# Altium schematic symbol library IC_TI.SCHLIB: 1162 symbols (part 2 of 8)
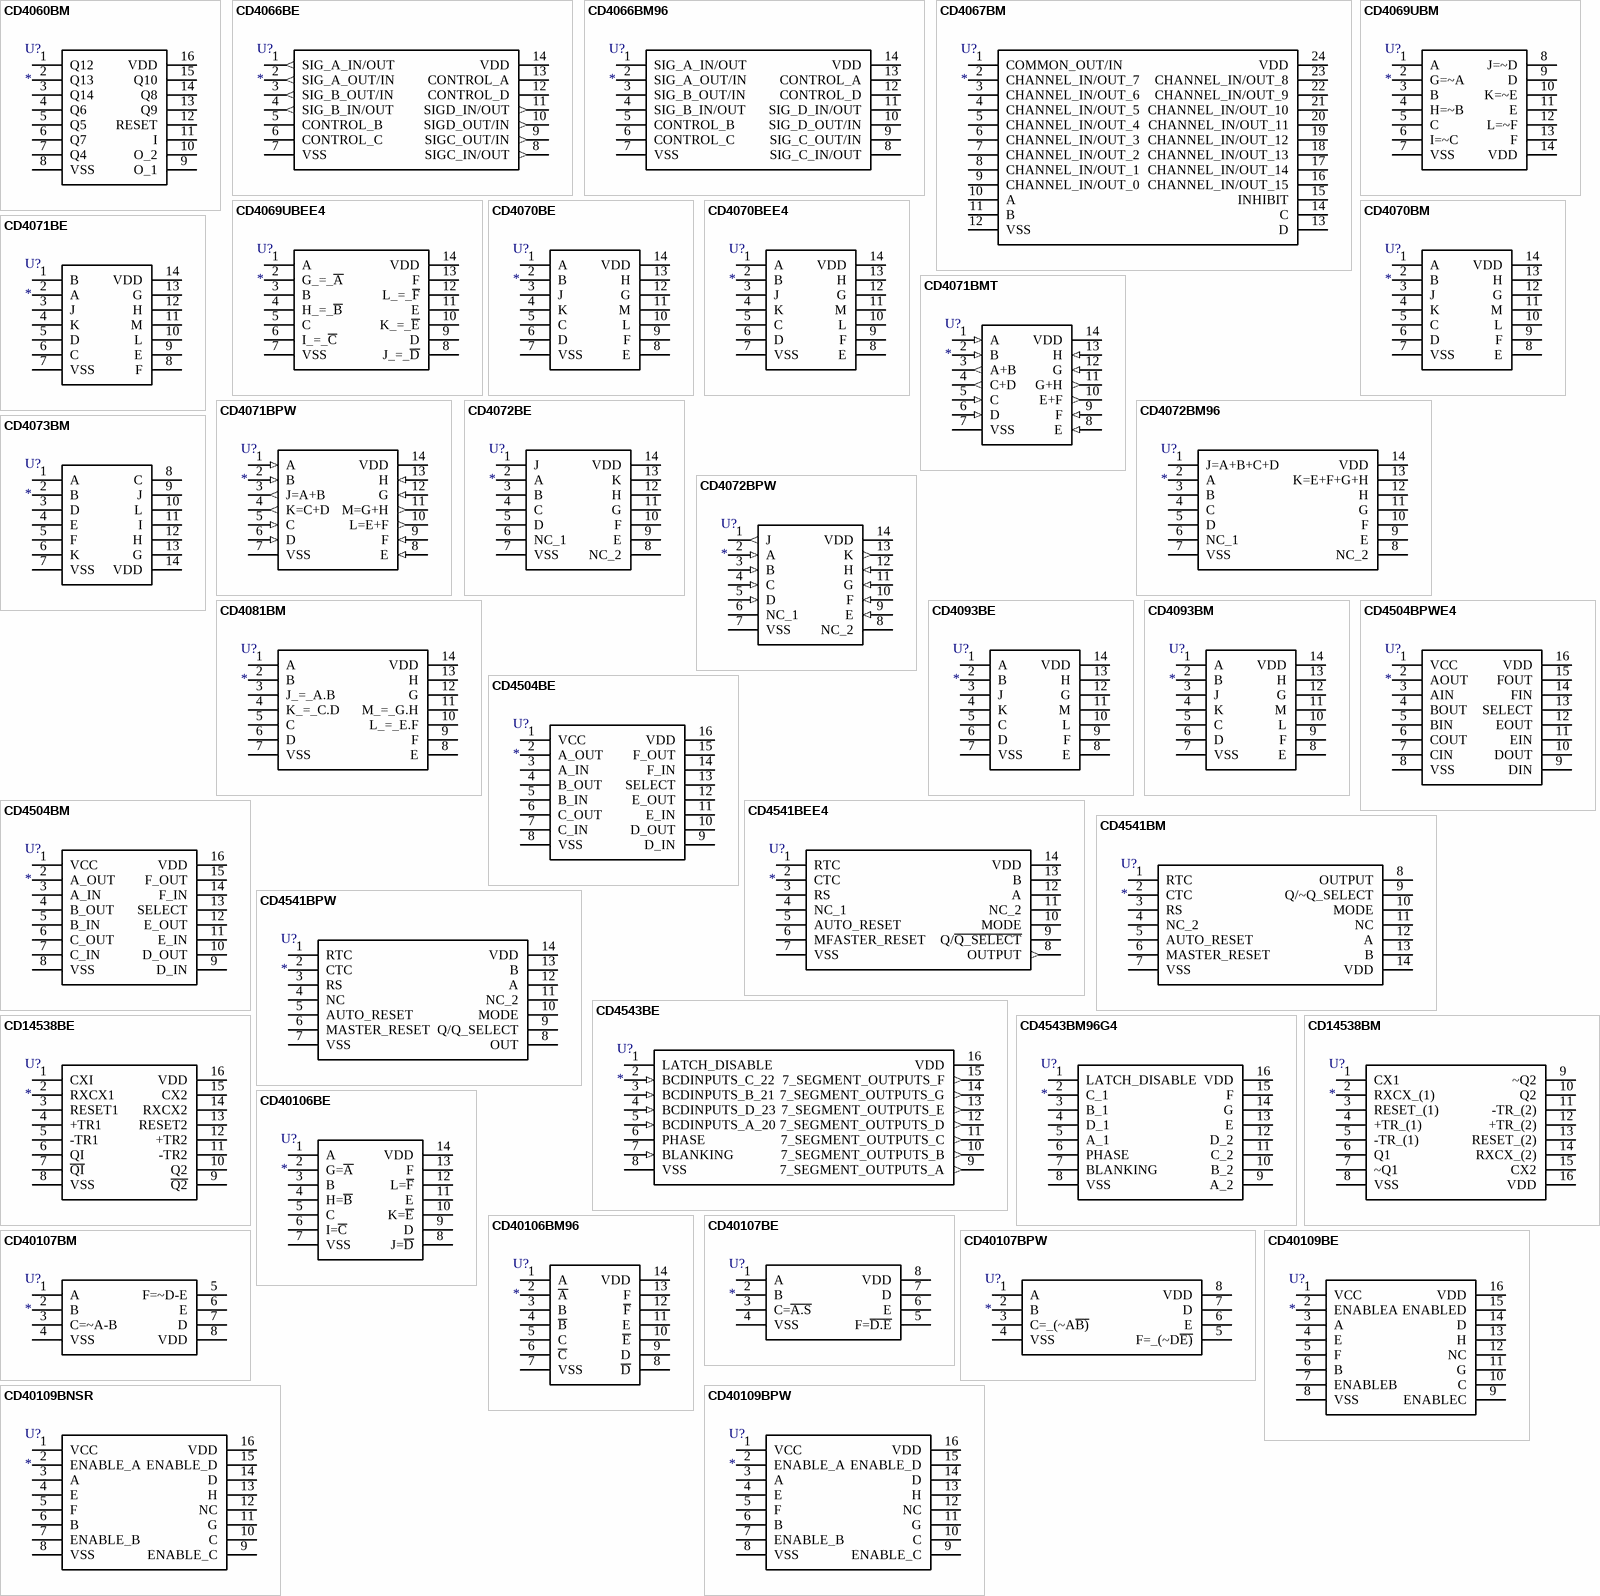
[diagram p36: symbols CD4060BM to CD40109BPW]

## CD4093BE
designator U?
Integrated Circuit; Manufacturer_Name: Texas Instruments; Manufacturer_Part_Number: CD4093BE; Datasheet Link: http://docs-emea.rs-online.com/webdocs/0b73/0900766b80b73c59.pdf; Height: 5.08mm; Mouser Part Number: 595-CD4093BE; Mouser Price/Stock: https://www.mouser.com/Search/Refine.aspx?Keyword=595-CD4093BE; RS Part Number: 2508242628; RS Price/Stock: http://uk.rs-online.com/web/p/products/2508242628
footprint DIP14-A
pins: 1 A, 2 B, 3 J, 4 K, 5 C, 6 D, 7 VSS (power), 8 E, 9 F, 10 L, 11 M, 12 G, 13 H, 14 VDD (power)

## CD4093BM
designator U?
Integrated Circuit; Manufacturer_Name: Texas Instruments; Manufacturer_Part_Number: CD4093BM; Datasheet Link: http://docs-emea.rs-online.com/webdocs/0cab/0900766b80cab43f.pdf; Height: 1.75mm; Mouser Part Number: 595-CD4093BM; Mouser Price/Stock: https://www.mouser.com/Search/Refine.aspx?Keyword=595-CD4093BM; RS Part Number: 9222909; RS Price/Stock: http://uk.rs-online.com/web/p/products/9222909
footprint SOIC14_1.27
pins: 1 A, 2 B, 3 J, 4 K, 5 C, 6 D, 7 VSS (power), 8 E, 9 F, 10 L, 11 M, 12 G, 13 H, 14 VDD (power)

## CD4504BE
designator U?
Integrated Circuit; Manufacturer_Name: Texas Instruments; Manufacturer_Part_Number: CD4504BE; Datasheet Link: http://www.ti.com/lit/gpn/cd4504b; Height: 5.08mm; Mouser Part Number: 595-CD4504BE; Mouser Price/Stock: https://www.mouser.com/Search/Refine.aspx?Keyword=595-CD4504BE
footprint DIP16-A
pins: 1 VCC, 2 A_OUT, 3 A_IN, 4 B_OUT, 5 B_IN, 6 C_OUT, 7 C_IN, 8 VSS, 9 D_IN, 10 D_OUT, 11 E_IN, 12 E_OUT, 13 SELECT, 14 F_IN, 15 F_OUT, 16 VDD

## CD4504BM
designator U?
Integrated Circuit; Manufacturer_Name: Texas Instruments; Manufacturer_Part_Number: CD4504BM; Datasheet Link: http://www.ti.com/lit/gpn/cd4504b; Height: 1.75mm; Mouser Part Number: 595-CD4504BM; Mouser Price/Stock: https://www.mouser.com/Search/Refine.aspx?Keyword=595-CD4504BM; RS Part Number: 1627241; RS Price/Stock: http://uk.rs-online.com/web/p/products/1627241
footprint SOIC16_1.27
pins: 1 VCC, 2 A_OUT, 3 A_IN, 4 B_OUT, 5 B_IN, 6 C_OUT, 7 C_IN, 8 VSS, 9 D_IN, 10 D_OUT, 11 E_IN, 12 E_OUT, 13 SELECT, 14 F_IN, 15 F_OUT, 16 VDD

## CD4504BPWE4
designator U?
Integrated Circuit; Manufacturer_Name: Texas Instruments; Manufacturer_Part_Number: CD4504BPWE4; Datasheet Link: http://www.ti.com/lit/gpn/CD4504B; Height: 1.2mm; Mouser Part Number: 595-CD4504BPWE4; Mouser Price/Stock: https://www.mouser.com/Search/Refine.aspx?Keyword=595-CD4504BPWE4
footprint TSSOP16_0.65 (Shrink Small Outline; 16 Leads; Body Width 4.4 mm; Pitch 0.65 mm)
pins: 1 VCC, 2 AOUT, 3 AIN, 4 BOUT, 5 BIN, 6 COUT, 7 CIN, 8 VSS, 9 DIN, 10 DOUT, 11 EIN, 12 EOUT, 13 SELECT, 14 FIN, 15 FOUT, 16 VDD

## CD4541BEE4
designator U?
Integrated Circuit; Manufacturer_Name: Texas Instruments; Manufacturer_Part_Number: CD4541BEE4; Datasheet Link: http://docs-emea.rs-online.com/webdocs/14cc/0900766b814cc35e.pdf; Height: 5.08mm; Mouser Part Number: 595-CD4541BEE4; Mouser Price/Stock: https://www.mouser.com/Search/Refine.aspx?Keyword=595-CD4541BEE4; RS Part Number: 9236712; RS Price/Stock: http://uk.rs-online.com/web/p/products/9236712
footprint DIP14-A
pins: 1 RTC, 2 CTC, 3 RS, 4 NC_1, 5 AUTO_RESET, 6 MFASTER_RESET, 7 VSS (power), 8 OUTPUT (out), 9 Q/~{Q_SELECT}, 10 MODE, 11 NC_2, 12 A, 13 B, 14 VDD (power)

## CD4541BM
designator U?
Integrated Circuit; Manufacturer_Name: Texas Instruments; Manufacturer_Part_Number: CD4541BM; Datasheet Link: http://www.ti.com/lit/gpn/cd4541b; Mouser Part Number: 595-CD4541BM; Mouser Price/Stock: https://www.mouser.com/Search/Refine.aspx?Keyword=595-CD4541BM; RS Part Number: 6624668P; RS Price/Stock: http://uk.rs-online.com/web/p/products/6624668P
footprint SOIC14_1.27
pins: 1 RTC, 2 CTC, 3 RS, 4 NC_2, 5 AUTO_RESET, 6 MASTER_RESET, 7 VSS, 8 OUTPUT, 9 Q/~Q_SELECT, 10 MODE, 11 NC, 12 A, 13 B, 14 VDD

## CD4541BPW
designator U?
Integrated Circuit; Manufacturer_Name: Texas Instruments; Manufacturer_Part_Number: CD4541BPW; Mouser Part Number: 595-CD4541BPW; Mouser Price/Stock: https://www.mouser.com/Search/Refine.aspx?Keyword=595-CD4541BPW; RS Part Number: 8096232P; RS Price/Stock: http://uk.rs-online.com/web/p/products/8096232P
footprint TSSOP14_0.65 (TSOP, 14-Leads, Body 5.00x4.40mm, Pitch 0.65mm, Thermal Pad 2.31x2.46mm, IPC Low Density)
pins: 1 RTC, 2 CTC, 3 RS, 4 NC, 5 AUTO_RESET, 6 MASTER_RESET, 7 VSS, 8 OUT, 9 Q/Q_SELECT, 10 MODE, 11 NC_2, 12 A, 13 B, 14 VDD

## CD4543BE
designator U?
Integrated Circuit; Manufacturer_Name: Texas Instruments; Manufacturer_Part_Number: CD4543BE; Datasheet Link: http://www.ti.com/lit/ds/symlink/cd4543b.pdf; Height: 5.08mm; Mouser Part Number: 595-CD4543BE; Mouser Price/Stock: https://www.mouser.com/Search/Refine.aspx?Keyword=595-CD4543BE; RS Part Number: 2508239155; RS Price/Stock: http://uk.rs-online.com/web/p/products/2508239155
footprint DIP16-A
pins: 1 LATCH_DISABLE, 2 BCDINPUTS_C_22 (in), 3 BCDINPUTS_B_21 (in), 4 BCDINPUTS_D_23 (in), 5 BCDINPUTS_A_20 (in), 6 PHASE, 7 BLANKING (in), 8 VSS (power), 9 7_SEGMENT_OUTPUTS_A (out), 10 7_SEGMENT_OUTPUTS_B (out), 11 7_SEGMENT_OUTPUTS_C (out), 12 7_SEGMENT_OUTPUTS_D (out), 13 7_SEGMENT_OUTPUTS_E (out), 14 7_SEGMENT_OUTPUTS_G (out), 15 7_SEGMENT_OUTPUTS_F (out), 16 VDD (power)

## CD4543BM96G4
designator U?
Integrated Circuit; Manufacturer_Name: Texas Instruments; Manufacturer_Part_Number: CD4543BM96G4; Datasheet Link: http://www.ti.com/lit/ds/symlink/cd4543b.pdf; Height: 1.75mm; Mouser Part Number: 595-CD4543BM96G4; Mouser Price/Stock: https://www.mouser.com/Search/Refine.aspx?Keyword=595-CD4543BM96G4
footprint SOIC16_1.27
pins: 1 LATCH_DISABLE, 2 C_1, 3 B_1, 4 D_1, 5 A_1, 6 PHASE, 7 BLANKING, 8 VSS, 9 A_2, 10 B_2, 11 C_2, 12 D_2, 13 E, 14 G, 15 F, 16 VDD

## CD14538BE
designator U?
Integrated Circuit; Manufacturer_Name: Texas Instruments; Manufacturer_Part_Number: CD14538BE; Datasheet Link: http://www.ti.com/lit/ds/symlink/cd14538b.pdf; Height: 5.08mm; Mouser Part Number: 595-CD14538BE; Mouser Price/Stock: https://www.mouser.com/Search/Refine.aspx?Keyword=595-CD14538BE; RS Part Number: 2508238461; RS Price/Stock: http://uk.rs-online.com/web/p/products/2508238461
footprint DIP16-A
pins: 1 CXI, 2 RXCX1, 3 RESET1, 4 +TR1, 5 -TR1, 6 QI, 7 ~{QI}, 8 VSS (power), 9 ~{Q2}, 10 Q2, 11 -TR2, 12 +TR2, 13 RESET2, 14 RXCX2, 15 CX2, 16 VDD (power)

## CD14538BM
designator U?
Integrated Circuit; Manufacturer_Name: Texas Instruments; Manufacturer_Part_Number: CD14538BM; Datasheet Link: http://www.ti.com/lit/gpn/cd14538b; Mouser Part Number: 595-CD14538BM; Mouser Price/Stock: https://www.mouser.com/Search/Refine.aspx?Keyword=595-CD14538BM; RS Part Number: 8072343; RS Price/Stock: http://uk.rs-online.com/web/p/products/8072343
footprint SOIC16_1.27
pins: 1 CX1, 2 RXCX_(1), 3 RESET_(1), 4 +TR_(1), 5 -TR_(1), 6 Q1, 7 ~Q1, 8 VSS, 9 ~Q2, 10 Q2, 11 -TR_(2), 12 +TR_(2), 13 RESET_(2), 14 RXCX_(2), 15 CX2, 16 VDD

## CD40106BE
designator U?
Integrated Circuit; Manufacturer_Name: Texas Instruments; Manufacturer_Part_Number: CD40106BE; Datasheet Link: http://www.ti.com/lit/ds/symlink/cd40106b.pdf; Height: 5.08mm; Mouser Part Number: 595-CD40106BE; Mouser Price/Stock: https://www.mouser.com/Search/Refine.aspx?Keyword=595-CD40106BE; RS Part Number: 1218347; RS Price/Stock: http://uk.rs-online.com/web/p/products/1218347
footprint DIP14-A
pins: 1 A, 2 G=~{A}, 3 B, 4 H=~{B}, 5 C, 6 I=~{C}, 7 VSS (power), 8 J=~{D} (power), 9 D, 10 K=~{E}, 11 E, 12 L=~{F}, 13 F, 14 VDD (power)

## CD40106BM96
designator U?
Integrated Circuit; Manufacturer_Name: Texas Instruments; Manufacturer_Part_Number: CD40106BM96; Datasheet Link: http://www.ti.com/lit/gpn/cd40106b; Height: 1.75mm; Mouser Part Number: 595-CD40106BM96; Mouser Price/Stock: https://www.mouser.com/Search/Refine.aspx?Keyword=595-CD40106BM96; RS Part Number: 6626807P; RS Price/Stock: http://uk.rs-online.com/web/p/products/6626807P
footprint SOIC14_1.27
pins: 1 A, 2 ~{A}, 3 B, 4 ~{B}, 5 C, 6 ~{C}, 7 VSS, 8 ~{D}, 9 D, 10 ~{E}, 11 E, 12 ~{F}, 13 F, 14 VDD

## CD40107BE
designator U?
Integrated Circuit; Manufacturer_Name: Texas Instruments; Manufacturer_Part_Number: CD40107BE; Datasheet Link: http://www.ti.com/lit/ds/symlink/cd40107b.pdf; Height: 5.08mm; Mouser Part Number: 595-CD40107BE; Mouser Price/Stock: https://www.mouser.com/Search/Refine.aspx?Keyword=595-CD40107BE; RS Part Number: 2508238562; RS Price/Stock: http://uk.rs-online.com/web/p/products/2508238562
footprint DIP8-A
pins: 1 A, 2 B, 3 C=~{A.S}, 4 VSS (power), 5 F=~{D.E}, 6 E, 7 D, 8 VDD (power)

## CD40107BM
designator U?
Integrated Circuit; Manufacturer_Name: Texas Instruments; Manufacturer_Part_Number: CD40107BM; Mouser Part Number: 595-CD40107BM; Mouser Price/Stock: https://www.mouser.com/Search/Refine.aspx?Keyword=595-CD40107BM; RS Part Number: 1456874; RS Price/Stock: http://uk.rs-online.com/web/p/products/1456874
footprint SOIC8_1.27 (SOP, 8-Leads, Pitch 1.27mm)
pins: 1 A, 2 B, 3 C=~A-B, 4 VSS, 5 F=~D-E, 6 E, 7 D, 8 VDD

## CD40107BPW
designator U?
Integrated Circuit; Manufacturer_Name: Texas Instruments; Manufacturer_Part_Number: CD40107BPW; Mouser Part Number: 595-CD40107BPW; Mouser Price/Stock: https://www.mouser.com/Search/Refine.aspx?Keyword=595-CD40107BPW
footprint TSSOP8_0.65
pins: 1 A, 2 B, 3 C=_(~A~{B)}, 4 VSS, 5 F=_(~D~{E)}, 6 E, 7 D, 8 VDD

## CD40109BE
designator U?
Integrated Circuit; Manufacturer_Name: Texas Instruments; Manufacturer_Part_Number: CD40109BE; Datasheet Link: http://www.ti.com/lit/ds/symlink/cd40109b.pdf; Height: 5.08mm; Mouser Part Number: 595-CD40109BE; Mouser Price/Stock: https://www.mouser.com/Search/Refine.aspx?Keyword=595-CD40109BE; RS Part Number: 2508238578; RS Price/Stock: http://uk.rs-online.com/web/p/products/2508238578
footprint DIP16-A
pins: 1 VCC (power), 2 ENABLEA, 3 A, 4 E, 5 F, 6 B, 7 ENABLEB, 8 VSS (power), 9 ENABLEC, 10 C, 11 G, 12 NC, 13 H, 14 D, 15 ENABLED, 16 VDD (power)

## CD40109BNSR
designator U?
Integrated Circuit; Manufacturer_Name: Texas Instruments; Manufacturer_Part_Number: CD40109BNSR; Datasheet Link: http://www.ti.com/lit/ds/symlink/cd40109b.pdf; Height: 2mm; Mouser Part Number: 595-CD40109BNSR; Mouser Price/Stock: https://www.mouser.com/Search/Refine.aspx?Keyword=595-CD40109BNSR; RS Part Number: 8096166P; RS Price/Stock: http://uk.rs-online.com/web/p/products/8096166P
footprint SOP16W_1.27
pins: 1 VCC, 2 ENABLE_A, 3 A, 4 E, 5 F, 6 B, 7 ENABLE_B, 8 VSS, 9 ENABLE_C, 10 C, 11 G, 12 NC, 13 H, 14 D, 15 ENABLE_D, 16 VDD

## CD40109BPW
designator U?
Integrated Circuit; Manufacturer_Name: Texas Instruments; Manufacturer_Part_Number: CD40109BPW; Datasheet Link: http://uk.rs-online.com/web/p/products/6629515; Height: 1.2mm; Mouser Part Number: 595-CD40109BPW; Mouser Price/Stock: https://www.mouser.com/Search/Refine.aspx?Keyword=595-CD40109BPW; RS Part Number: 6629515P; RS Price/Stock: http://uk.rs-online.com/web/p/products/6629515P
footprint TSSOP16_0.65 (Shrink Small Outline; 16 Leads; Body Width 4.4 mm; Pitch 0.65 mm)
pins: 1 VCC, 2 ENABLE_A, 3 A, 4 E, 5 F, 6 B, 7 ENABLE_B, 8 VSS, 9 ENABLE_C, 10 C, 11 G, 12 NC, 13 H, 14 D, 15 ENABLE_D, 16 VDD

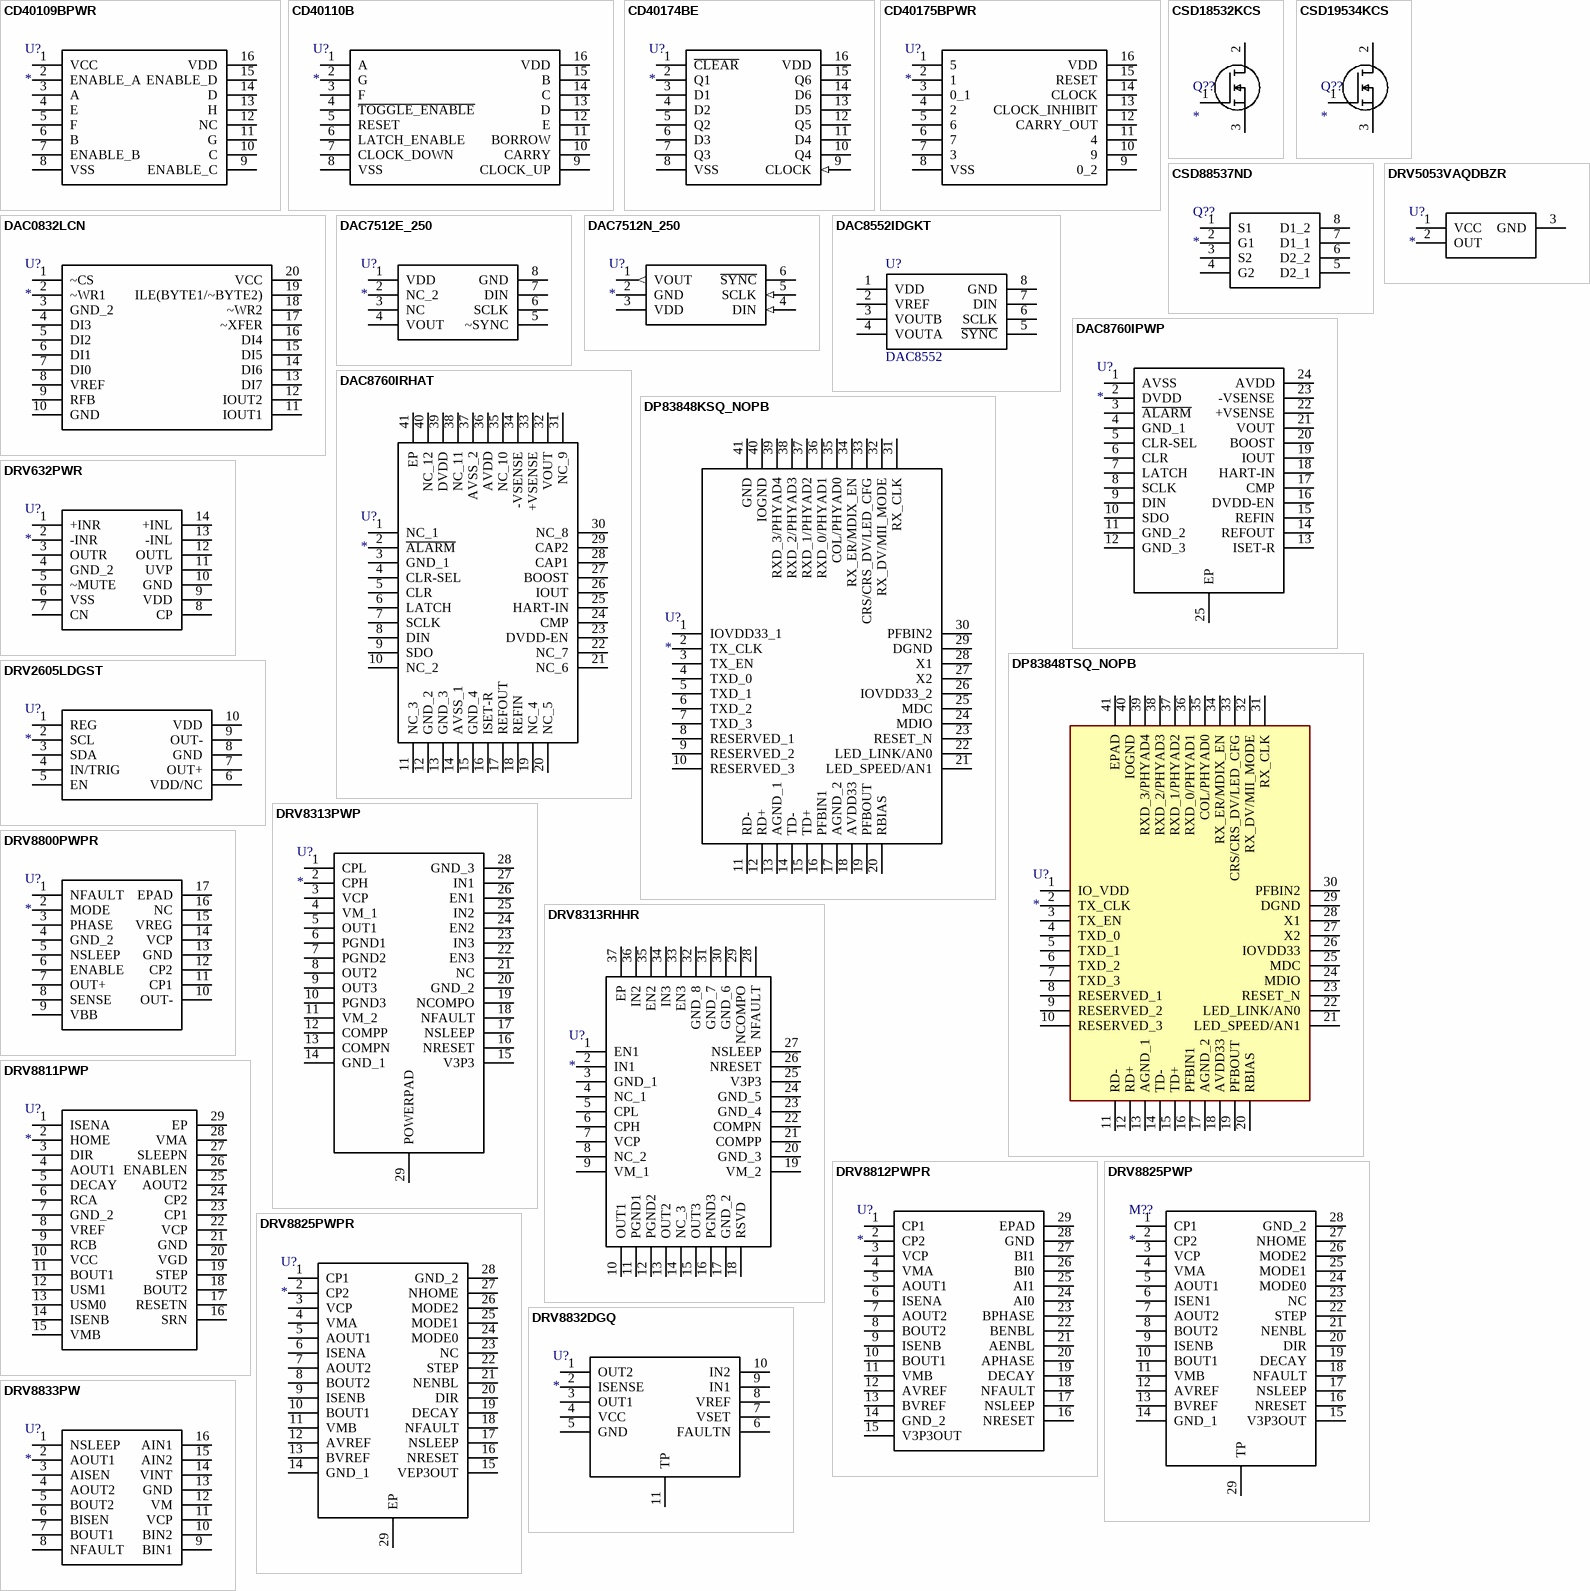
[diagram p5: symbols CD40109BPWR to DRV8833PW]

## CD40109BPWR
designator U?
Integrated Circuit; Manufacturer_Name: Texas Instruments; Manufacturer_Part_Number: CD40109BPWR; Datasheet Link: http://www.ti.com/lit/gpn/cd40109b; Height: 1.2mm; Mouser Part Number: 595-CD40109BPWR; Mouser Price/Stock: https://www.mouser.com/Search/Refine.aspx?Keyword=595-CD40109BPWR
footprint TSSOP16_0.65 (Shrink Small Outline; 16 Leads; Body Width 4.4 mm; Pitch 0.65 mm)
pins: 1 VCC, 2 ENABLE_A, 3 A, 4 E, 5 F, 6 B, 7 ENABLE_B, 8 VSS, 9 ENABLE_C, 10 C, 11 G, 12 NC, 13 H, 14 D, 15 ENABLE_D, 16 VDD

## CD40110B
designator U?
Integrated Circuit; Manufacturer_Name: Texas Instruments; Manufacturer_Part_Number: CD40110B; Datasheet Link: http://www.ti.com/lit/ds/symlink/cd40110b.pdf; Height: 5.08mm
footprint DIP16-A
pins: 1 A, 2 G, 3 F, 4 ~{TOGGLE_ENABLE}, 5 RESET, 6 LATCH_ENABLE, 7 CLOCK_DOWN, 8 VSS, 9 CLOCK_UP, 10 CARRY, 11 BORROW, 12 E, 13 D, 14 C, 15 B, 16 VDD

## CD40174BE
designator U?
Integrated Circuit; Manufacturer_Name: Texas Instruments; Manufacturer_Part_Number: CD40174BE; Datasheet Link: http://www.ti.com/lit/ds/symlink/cd40174b.pdf; Height: 5.08mm; Mouser Part Number: 595-CD40174BE; Mouser Price/Stock: https://www.mouser.com/Search/Refine.aspx?Keyword=595-CD40174BE; RS Part Number: 2508715851; RS Price/Stock: http://uk.rs-online.com/web/p/products/2508715851
footprint DIP16-A
pins: 1 ~{CLEAR}, 2 Q1, 3 D1, 4 D2, 5 Q2, 6 D3, 7 Q3, 8 VSS (power), 9 CLOCK (in), 10 Q4, 11 D4, 12 Q5, 13 D5, 14 D6, 15 Q6, 16 VDD (power)

## CD40175BPWR
designator U?
Integrated Circuit; Manufacturer_Name: Texas Instruments; Manufacturer_Part_Number: CD40175BPWR; Datasheet Link: http://www.ti.com/lit/gpn/cd4017b; Height: 1.2mm; Mouser Part Number: 595-CD40175BPWR; Mouser Price/Stock: https://www.mouser.com/Search/Refine.aspx?Keyword=595-CD40175BPWR; RS Part Number: 1456752; RS Price/Stock: http://uk.rs-online.com/web/p/products/1456752
footprint TSSOP16_0.65 (Shrink Small Outline; 16 Leads; Body Width 4.4 mm; Pitch 0.65 mm)
pins: 1 5, 2 1, 3 0_1, 4 2, 5 6, 6 7, 7 3, 8 VSS, 9 0_2, 10 9, 11 4, 12 CARRY_OUT, 13 CLOCK_INHIBIT, 14 CLOCK, 15 RESET, 16 VDD

## CSD18532KCS
designator Q??
MOSFET (N-Channel); Manufacturer_Name: Texas Instruments; Manufacturer_Part_Number: CSD18532KCS; Datasheet Link: http://www.ti.com/lit/ds/symlink/csd18532kcs.pdf; Height: 4.7mm; Mouser Part Number: 595-CSD18532KCS; Mouser Price/Stock: https://www.mouser.com/Search/Refine.aspx?Keyword=595-CSD18532KCS; RS Part Number: 1628554; RS Price/Stock: http://uk.rs-online.com/web/p/products/1628554
footprint TO220-3
pins: 1 G, 2 D, 3 S

## CSD19534KCS
designator Q??
MOSFET (N-Channel); Manufacturer_Name: Texas Instruments; Manufacturer_Part_Number: CSD19534KCS; Datasheet Link: http://www.ti.com/lit/gpn/csd19534kcs; Height: 4.7mm; Mouser Part Number: 595-CSD19534KCS; Mouser Price/Stock: https://www.mouser.com/Search/Refine.aspx?Keyword=595-CSD19534KCS; RS Part Number: 9009964P; RS Price/Stock: http://uk.rs-online.com/web/p/products/9009964P
footprint TO220-3
pins: 1 G, 2 D, 3 S

## CSD88537ND
designator Q??
MOSFET (N-Channel); Manufacturer_Name: Texas Instruments; Manufacturer_Part_Number: CSD88537ND; Datasheet Link: http://www.ti.com/lit/gpn/csd88537nd; Height: 1.75mm; Mouser Part Number: 595-CSD88537ND; Mouser Price/Stock: https://www.mouser.com/Search/Refine.aspx?Keyword=595-CSD88537ND
footprint SOIC8_1.27 (SOP, 8-Leads, Pitch 1.27mm)
pins: 1 S1, 2 G1, 3 S2, 4 G2, 5 D2_1, 6 D2_2, 7 D1_1, 8 D1_2

## DAC0832LCN
designator U?
Integrated Circuit; Manufacturer_Name: Texas Instruments; Manufacturer_Part_Number: DAC0832LCN; Mouser Part Number: 926-DAC0832LCN; Mouser Price/Stock: https://www.mouser.com/Search/Refine.aspx?Keyword=926-DAC0832LCN
footprint DIP20
pins: 1 ~CS, 2 ~WR1, 3 GND_2, 4 DI3, 5 DI2, 6 DI1, 7 DI0, 8 VREF, 9 RFB, 10 GND, 11 IOUT1, 12 IOUT2, 13 DI7, 14 DI6, 15 DI5, 16 DI4, 17 ~XFER, 18 ~WR2, 19 ILE(BYTE1/~BYTE2), 20 VCC

## DAC7512E_250
designator U?
Integrated Circuit; Manufacturer_Name: Texas Instruments; Manufacturer_Part_Number: DAC7512E/250; Datasheet Link: http://www.ti.com/lit/gpn/dac7512; Mouser Part Number: 595-DAC7512E/250; Mouser Price/Stock: https://www.mouser.com/Search/Refine.aspx?Keyword=595-DAC7512E%2F250; RS Part Number: 6621442; RS Price/Stock: http://uk.rs-online.com/web/p/products/6621442
footprint VSSOP8_0.65-PAD
pins: 1 VDD, 2 NC_2, 3 NC, 4 VOUT, 5 ~SYNC, 6 SCLK, 7 DIN, 8 GND

## DAC7512N_250
designator U?
Integrated Circuit; Manufacturer_Name: Texas Instruments; Manufacturer_Part_Number: DAC7512N/250; Datasheet Link: http://www.ti.com/lit/ds/symlink/dac7512.pdf; Height: 1.45mm; Mouser Part Number: 595-DAC7512N/250; Mouser Price/Stock: https://www.mouser.com/Search/Refine.aspx?Keyword=595-DAC7512N%2F250; RS Part Number: 6621451P; RS Price/Stock: http://uk.rs-online.com/web/p/products/6621451P
footprint SOT23-6
pins: 1 VOUT (out), 2 GND (power), 3 VDD (power), 4 DIN (in), 5 SCLK (in), 6 ~{SYNC}

## DAC8552IDGKT
designator U?, comment DAC8552
Integrated Circuit; Manufacturer_Name: Texas Instruments; Manufacturer_Part_Number: DAC8552IDGKT; blog: www.jh-tec.cn
footprint VSSOP8_0.65
pins: 1 VDD, 2 VREF, 3 VOUTB, 4 VOUTA, 5 ~{SYNC}, 6 SCLK, 7 DIN, 8 GND

## DAC8760IPWP
designator U?
Integrated Circuit; Manufacturer_Name: Texas Instruments; Manufacturer_Part_Number: DAC8760IPWP; Datasheet Link: http://www.ti.com/lit/ds/symlink/dac7760.pdf; Height: 1.2mm; Mouser Part Number: 595-DAC8760IPWP; Mouser Price/Stock: https://www.mouser.com/Search/Refine.aspx?Keyword=595-DAC8760IPWP
footprint TSSOP24_0.65-PAD (TSOP, 24-Leads, Body 7.80x4.40mm, Pitch 0.65mm, Thermal Pad 5.16x2.40mm, IPC Low Density)
pins: 1 AVSS, 2 DVDD, 3 ~{ALARM}, 4 GND_1, 5 CLR-SEL, 6 CLR, 7 LATCH, 8 SCLK, 9 DIN, 10 SDO, 11 GND_2, 12 GND_3, 13 ISET-R, 14 REFOUT, 15 REFIN, 16 DVDD-EN, 17 CMP, 18 HART-IN, 19 IOUT, 20 BOOST, 21 VOUT, 22 +VSENSE, 23 -VSENSE, 24 AVDD, 25 EP

## DAC8760IRHAT
designator U?
Integrated Circuit; Manufacturer_Name: Texas Instruments; Manufacturer_Part_Number: DAC8760IRHAT; Datasheet Link: http://www.ti.com/lit/ds/symlink/dac7760.pdf; Height: 1mm; Mouser Part Number: 595-DAC8760IRHAT; Mouser Price/Stock: https://www.mouser.com/Search/Refine.aspx?Keyword=595-DAC8760IRHAT
footprint QFN40_0.5-PAD(6X6) (QFN, 40-Leads, Body 6.2x6.2mm (max), Pitch 0.50mm, IPC Low Density)
pins: 1 NC_1, 2 ~{ALARM}, 3 GND_1, 4 CLR-SEL, 5 CLR, 6 LATCH, 7 SCLK, 8 DIN, 9 SDO, 10 NC_2, 11 NC_3, 12 GND_2, 13 GND_3, 14 AVSS_1, 15 GND_4, 16 ISET-R, 17 REFOUT, 18 REFIN, 19 NC_4, 20 NC_5, 21 NC_6, 22 NC_7, 23 DVDD-EN, 24 CMP, 25 HART-IN, 26 IOUT, 27 BOOST, 28 CAP1, 29 CAP2, 30 NC_8, 31 NC_9, 32 VOUT, 33 +VSENSE, 34 -VSENSE, 35 NC_10, 36 AVDD, 37 AVSS_2, 38 NC_11, 39 DVDD, 40 NC_12, 41 EP

## DP83848KSQ_NOPB
designator U?
Integrated Circuit; Manufacturer_Name: Texas Instruments; Manufacturer_Part_Number: DP83848KSQ/NOPB; Datasheet Link: http://www.ti.com/lit/gpn/dp83848k; Height: 0.8mm; Mouser Part Number: 926-DP83848KSQ/NOPB; Mouser Price/Stock: https://www.mouser.com/Search/Refine.aspx?Keyword=926-DP83848KSQ%2FNOPB; RS Part Number: 0181180P; RS Price/Stock: http://uk.rs-online.com/web/p/products/0181180P
footprint QFN40_0.5-PAD(6X6) (QFN, 40-Leads, Body 6.2x6.2mm (max), Pitch 0.50mm, IPC Low Density)
pins: 1 IOVDD33_1, 2 TX_CLK, 3 TX_EN, 4 TXD_0, 5 TXD_1, 6 TXD_2, 7 TXD_3, 8 RESERVED_1, 9 RESERVED_2, 10 RESERVED_3, 11 RD-, 12 RD+, 13 AGND_1, 14 TD-, 15 TD+, 16 PFBIN1, 17 AGND_2, 18 AVDD33, 19 PFBOUT, 20 RBIAS, 21 LED_SPEED/AN1, 22 LED_LINK/AN0, 23 RESET_N, 24 MDIO, 25 MDC, 26 IOVDD33_2, 27 X2, 28 X1, 29 DGND, 30 PFBIN2, 31 RX_CLK, 32 RX_DV/MII_MODE, 33 CRS/CRS_DV/LED_CFG, 34 RX_ER/MDIX_EN, 35 COL/PHYAD0, 36 RXD_0/PHYAD1, 37 RXD_1/PHYAD2, 38 RXD_2/PHYAD3, 39 RXD_3/PHYAD4, 40 IOGND, 41 GND